# Altium integrated library TeCrea-Misc.IntLib: 96 symbols (part 2 of 2)
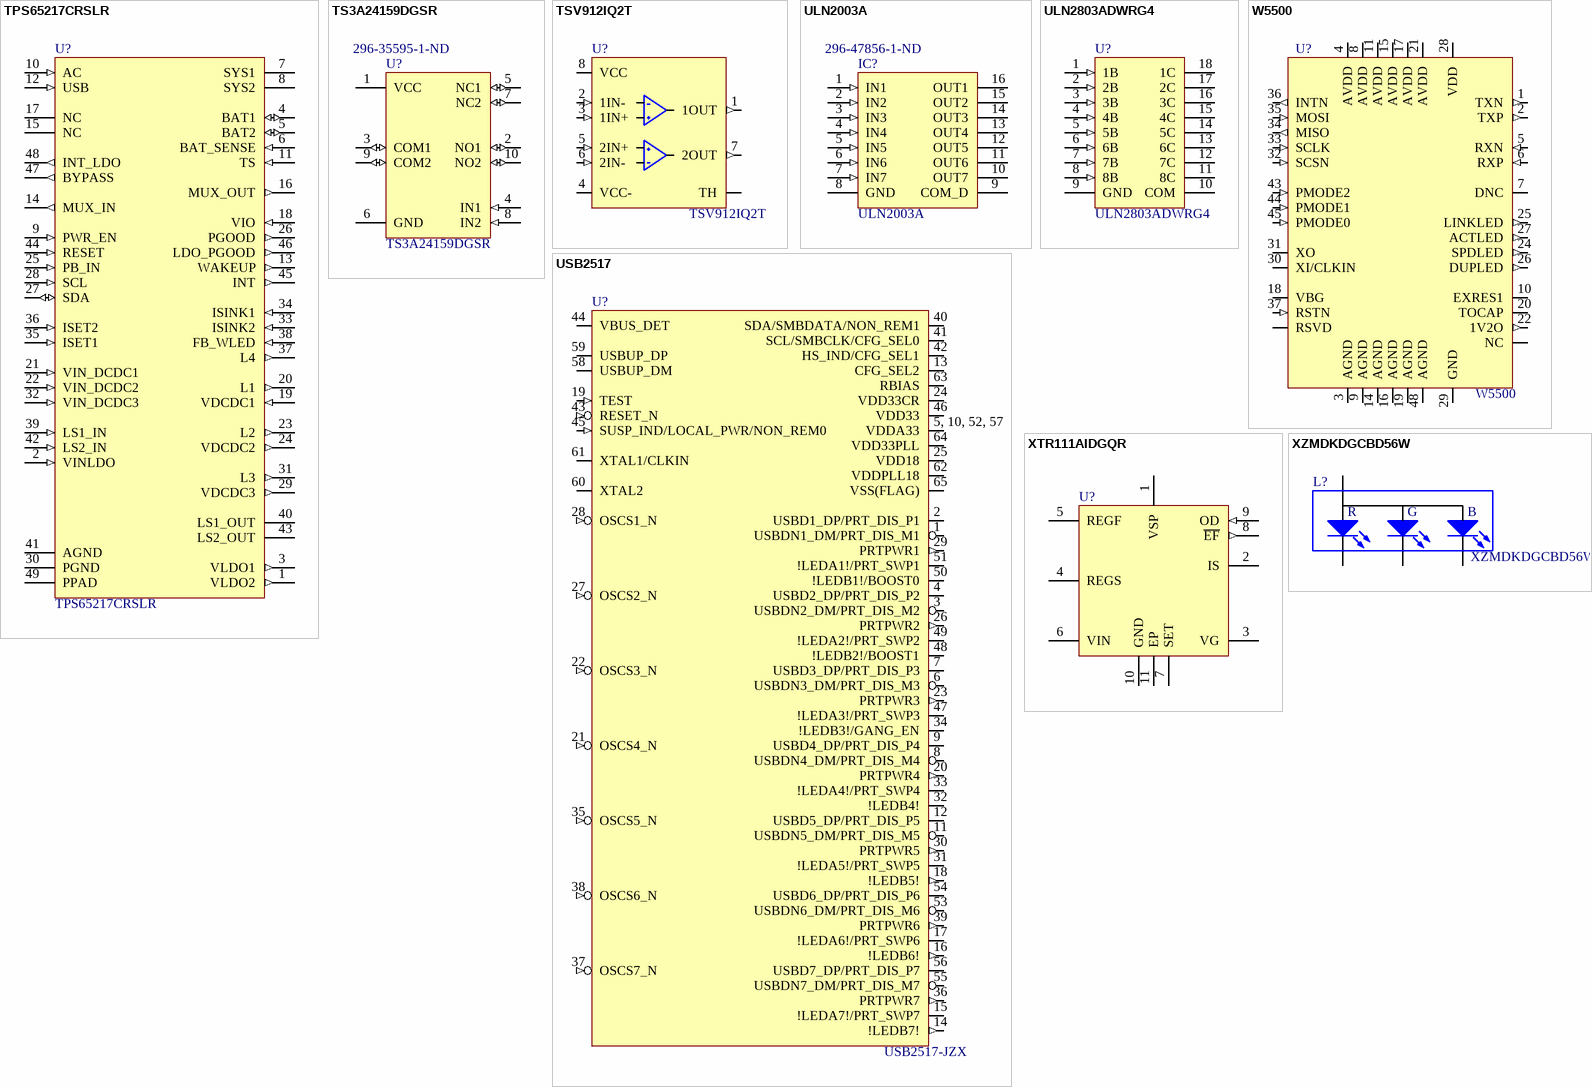
[diagram p5: symbols TPS65217CRSLR to XZMDKDGCBD56W]

## XTR111AIDGQR
designator U?
Precision Voltage To Current Converter/Transmitter 10-Pin HVSSOP EP T/R; Manufacturer 1: Texas Instruments; Manufacturer Part Number 1: XTR111AIDGQR; Output Current: 25mA; Nominal Supply Current: 450uA; Max Supply Voltage: 40V; Min Supply Voltage: 8V; Operating Supply Current: 550uA; Input Bias Current: 25nA; Input Offset Voltage (Vos): 1.5mV; Number of Channels: 1; Accuracy: 0.015%; Number of Amplifiers: 2; XTR111AIDGQR: Value; Supplier 1: Digi-Key; RoHS: Yes; Category: Interface ICs; Stock 1: 6254; Pricing 1: 1=1,69000, 10=1,51600, 25=1,43000, 100=1,14400, 250=1,00100, 500=0,97240, 1000=0,77220 (USD); Mount: Surface Mount; Case/Package: HTSSOP EP; Number of Pins: 10; Contact Plating: Gold; Min Operating Temperature: -40°C; Max Operating Temperature: 125°C; Packaging: Tape and Reel; Package Quantity: 2500; Output Type: Voltage; Output Current per Channel: 25mA; Radiation Hardening: No; Lead Free: Lead Free; REACH SVHC: No SVHC; ComponentLink1URL: https://datasheet.ciiva.com/15135/getdatasheetpartid-456570-15135022.pdf?src-supplier=Verical; ComponentLink1Description: https://datasheet.ciiva.com/15135/getdatasheetpartid-456570-15135022.pdf?src-supplier=Verical; ComponentLink2URL: https://datasheet.ciiva.com/26838/xtr111aidgqr-26838802.pdf?src-supplier=IIIC; ComponentLink2Description: https://datasheet.ciiva.com/26838/xtr111aidgqr-26838802.pdf?src-supplier=IIIC; ComponentLink3URL: https://datasheet.ciiva.com/1782/xtr111-1782019.pdf?src-supplier=Digi-Key; ComponentLink3Description: https://datasheet.ciiva.com/1782/xtr111-1782019.pdf?src-supplier=Digi-Key; Supplier Part Number 1: 296-39545-1-ND
footprint MSOP10-PWR
pins: 1 VSP, 2 IS, 3 VG, 4 REGS, 5 REGF, 6 VIN, 7 SET, 8 ~{EF} (out), 9 OD (in), 10 GND, 11 EP

## XZMDKDGCBD56W
designator L?
LED RGB CLEAR 4SMD R/A; Manufacturer: SunLED; Color: Red, Green, Blue (RGB); Lens Color: Colorless; Millicandela Rating: 79mcd Red, 297mcd Green, 69mcd Blue; Lens Style/Size: Rectangle with Domed Top, 2.00mm x 1.00mm; Voltage - Forward (Vf) (Typ): 1.95V Red, 3.3V Green, 3.3V Blue; Current - Test: 20mA Red, 20mA Green, 20mA Blue; Viewing Angle: 120°; Wavelength - Dominant: 630nm Red, 525nm Green, 465nm Blue; Wavelength - Peak: 645nm Red, 515nm Green, 460nm Blue; Supplier 1: Digi-Key; Manufacturer Part Number: XZMDKDGCBD56W; RoHS: RoHS Compliant; Category: Optoelectronics; Stock 1: 3380; Pricing 1: 1=1.22, 10=0.99, 25=0.7616, 100=0.6856, 250=0.6094, 500=0.518, 1000=0.42658 (USD); Packaging: Cut Tape (CT); Part Status: Active; Lens Transparency: Clear; Mounting Type: Surface Mount, Right Angle; Features: -; Package / Case: 4-SMD, No Lead; Supplier Device Package: Chip LED; Size / Dimension: 3.00mm L x 1.50mm W; Height (Max): 1.00mm; ComponentLink1URL: http://www.sunledusa.com/products/spec/XZMDKDGCBD56W.pdf; ComponentLink1Description: http://www.sunledusa.com/products/spec/XZMDKDGCBD56W.pdf; Value: XZMDKDGCBD56W
footprint XZMDKDGCBD56W
pins: 1 CGREEN, 2 CRED, 3 CBLUE, 4 A
text: R; G; B